# Altium footprint library PCB_DB_ADCS.PcbLib: 43 footprints (part 2 of 3)
Each footprint in its own frame and in the unit in brackets; x right, y up, seen from the top. Pads: shape width x height; smd on the part's side, far side on the other; paste and mask are expansions set on the pad; w line width, h text height; cw(c..) or ccw(c..) is an arc to the next point about the centre after c.
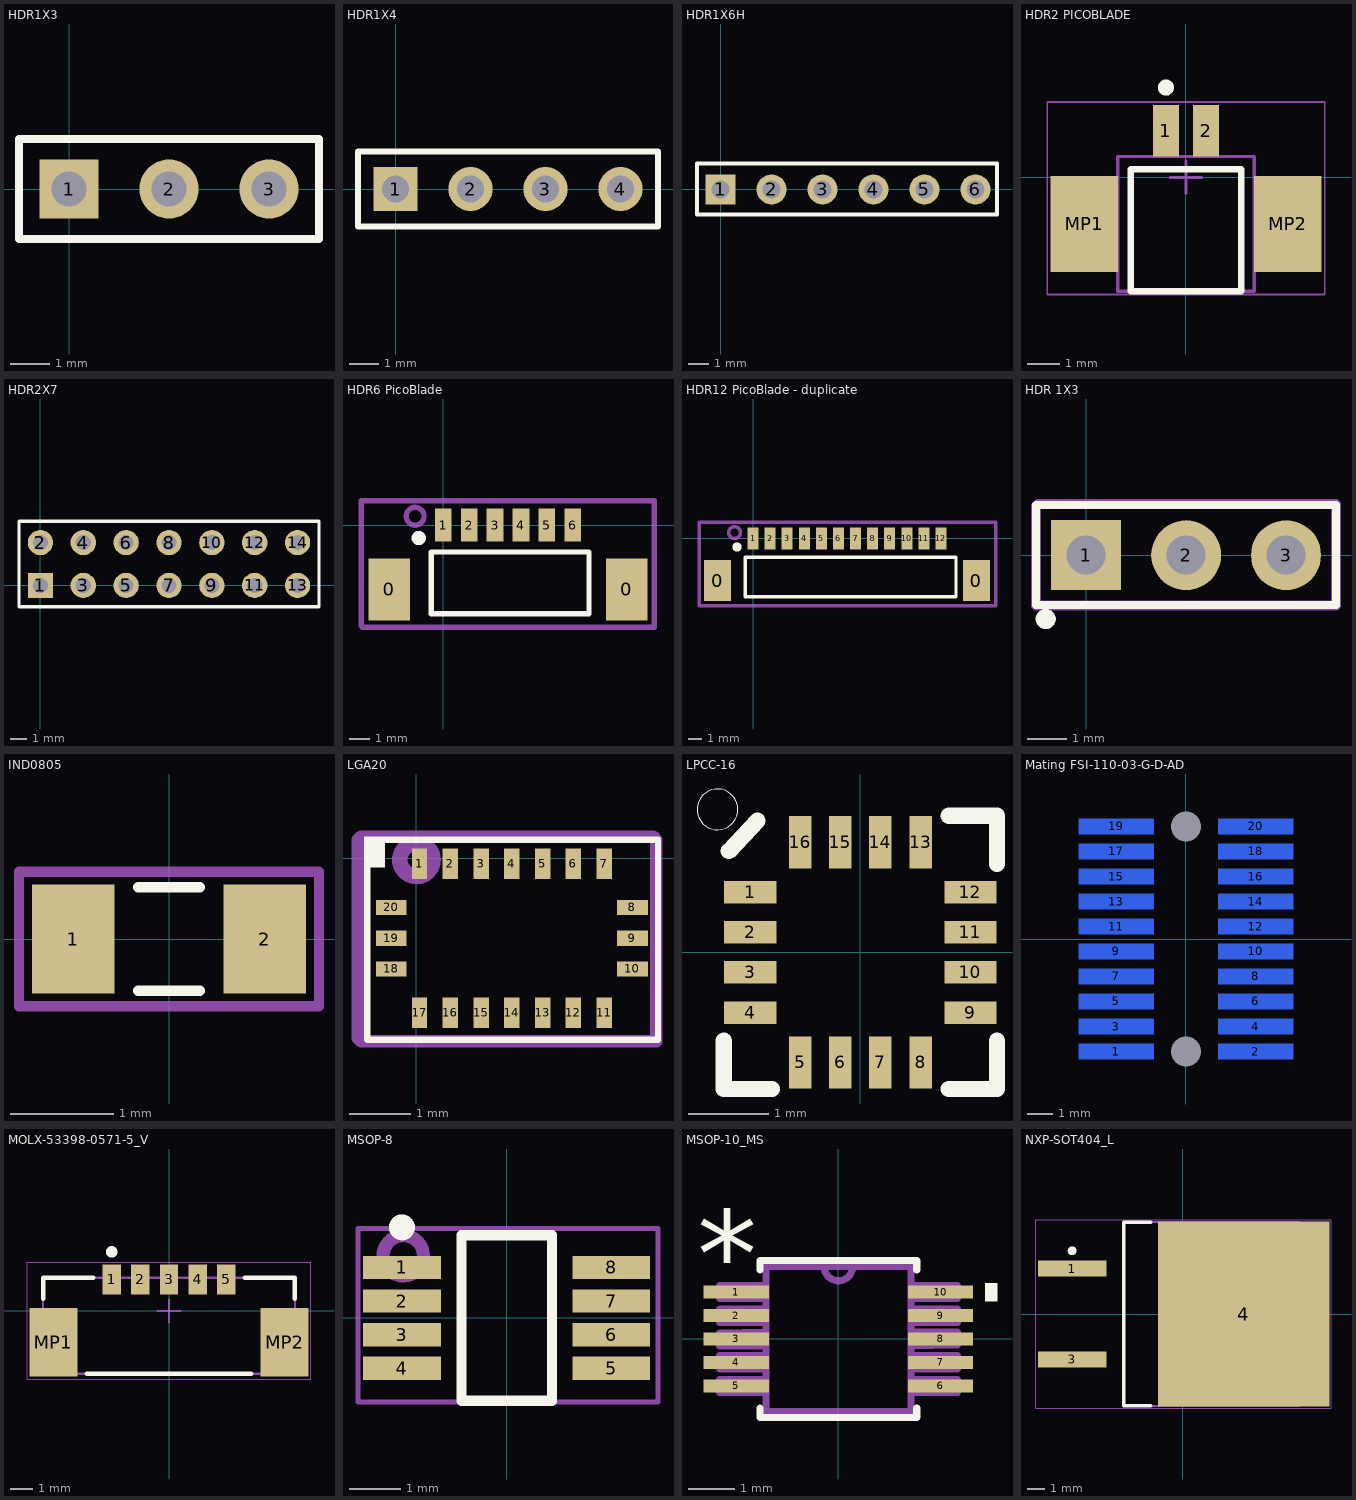
[diagram p1: the footprints below, top view; thin cyan lines are the x and y axes]

## HDR1X3 [mm]
pads (3):
  rect 1.5x1.5 hole 0.9: 1(0,0)
  round 1.5 hole 0.9: 2(2.54,0) 3(5.08,0)
Top Overlay:
  lines w0.2: -1.27,-1.27 6.35,-1.27 6.35,1.27 -1.27,1.27 -1.27,-1.27

## HDR1X4 [mm]
pads (4):
  rect 1.5x1.5 hole 0.9: 1(0,0)
  round 1.5 hole 0.9: 2(2.54,0) 3(5.08,0) 4(7.62,0)
Top Overlay:
  lines w0.2: -1.27,-1.27 8.89,-1.27 8.89,1.27 -1.27,1.27 -1.27,-1.27

## HDR1X6H [mm]
pads (6):
  rect 1.5x1.5 hole 0.9: 1(0,0)
  round 1.5 hole 0.9: 2(2.54,0) 3(5.08,0) 4(7.62,0) 5(10.16,0) 6(12.7,0)
Top Overlay:
  lines w0.2: -1.18,-1.24 13.78,-1.24 13.78,0.135 13.78,1.28 -1.18,1.28 -1.18,-1.24

## HDR2 PICOBLADE [mm] "Header, 2-Leads, Pitch 1.25mm"
height 3.4
pads (4):
  rect 0.8x1.6 smd: 1(-0.625,1.45) 2(0.625,1.45)
  rect 2.1x3 smd: MP1(-3.175,-1.45) MP2(3.175,-1.45)
Top Overlay:
  circle w0.25: c-0.625,2.8 r0.125
  lines w0.2: -1.725,-3.55 1.725,-3.55 1.725,0.25 -1.725,0.25 -1.725,-3.55
Mechanical 13:
  lines w0.1: -2.125,-3.55 2.125,-3.55 2.125,0.65 -2.125,0.65 -2.125,-3.55
Mechanical 15:
  lines w0.05: -4.325,-3.65 4.325,-3.65 4.325,2.35 -4.325,2.35 -4.325,-3.65
  lines w0.1: -0.5,0 0.5,0 ; 0,-0.5 0,0.5
3D body "532610271.stp": height 3.41, standoff 0.01, extent -3.825,-3.55 3.825,1.65

## HDR2X7 [mm]
pads (14):
  rect 1.5x1.5 hole 0.9: 1(0,0)
  round 1.5 hole 0.9: 2(0,2.54) 3(2.54,0) 4(2.54,2.54) 5(5.08,0) 6(5.08,2.54) 7(7.62,0) 8(7.62,2.54) 9(10.16,0) 10(10.16,2.54) 11(12.7,0) 12(12.7,2.54) 13(15.24,0) 14(15.24,2.54)
Top Overlay:
  lines w0.2: -1.27,-1.27 -1.27,3.81 16.51,3.81 16.51,-1.27 -1.27,-1.27

## HDR6 PicoBlade [mm]
pads (8):
  rect 2x3 smd: 0(-2.6,-3.1) 0(8.85,-3.1)
  rect 0.8x1.6 smd: 1(0,0) 2(1.25,0) 3(2.5,0) 4(3.75,0) 5(5,0) 6(6.25,0)
Top Overlay:
  circle w0.5: c-1.175,-0.625 r0.09
  lines w0.254: -0.574,-4.275 -0.574,-1.3 7.025,-1.3 7.025,-4.275 -0.574,-4.275
Mechanical 15:
  circle w0.254: c-1.35,0.425 r0.432
  lines w0.254: -3.95,-4.85 -3.875,-4.925 10.175,-4.925 10.175,1.175 -3.95,1.175 -3.95,-4.85
  text ".Designator" at 0.22,-0.39 h0.5
3D body "User Library-molex 5339853398-0671.STEP": height 4.7, standoff 0, extent -3.125,-4.325 9.525,-0.125

## HDR12 PicoBlade - duplicate [mm]
pads (14):
  rect 2x3 smd: 0(-2.6,-3.1) 0(16.35,-3.1)
  rect 0.8x1.6 smd: 1(0,0) 2(1.25,0) 3(2.5,0) 4(3.75,0) 5(5,0) 6(6.25,0) 7(7.5,0) 8(8.75,0) 9(10,0) 10(11.25,0) 11(12.5,0) 12(13.75,0)
Top Overlay:
  circle w0.5: c-1.175,-0.625 r0.09
  lines w0.254: -0.574,-4.275 14.85,-4.275 14.85,-1.372 -0.574,-1.372 -0.574,-4.275
Mechanical 15:
  circle w0.254: c-1.35,0.425 r0.432
  lines w0.254: 17.75,-4.925 -3.95,-4.925 -3.95,1.175 17.775,1.175 17.775,-4.85
  text ".Designator" at -2.57,-0.42 h0.5
3D body "User Library-molex 5339853398-1271.STEP": height 4.7, standoff 0, extent -3.2,-4.45 16.95,-0.25

## HDR 1X3 [mil]
pads (3):
  rect 70x70 hole 39: 1(0,0)
  round 70 hole 39: 2(100,0) 3(200,0)
Top Overlay:
  circle w10: c-40.45,-63.98 r5.02
  lines w8: -50,-50 -50,50 250,50 250,-50 -50,-50
Mechanical 15:
  lines w10: -50.2,-50.2 -50.2,49.21 -48.23,51.18 250,51.18 250,-50.2 -50.2,-50.2
  text ".Designator" at -29.13,-5.51 h19.68
3D body "Samtec-HTSW-103-07-G-S.STEP": height 330, standoff -100, extent -49.99,-49.99 250.01,50.01

## IND0805 [mm]
pads (2):
  rect 0.8x1.05 smd: 1(-0.925,0) 2(0.925,0)
Top Overlay:
  lines w0.1: -0.3,-0.5 0.3,-0.5 ; -0.3,0.5 0.3,0.5
Mechanical 15:
  lines w0.1: -1.45,-0.65 -1.45,0.65 1.45,0.65 1.45,-0.65 -1.45,-0.65
  text ".Designator" at -1.15,-0.1 h0.5
3D body "INDC0805(2012M).STEP": height 0.95, standoff 0, extent -1,-0.6 1,0.6

## LGA20 [mm]
pads (20):
  rect 0.25x0.5 smd: 1(0.05,-0.09) 2(0.55,-0.09) 3(1.05,-0.09) 4(1.55,-0.09) 5(2.05,-0.09) 6(2.55,-0.09) 7(3.05,-0.09) 11(3.05,-2.51) 12(2.55,-2.51) 13(2.05,-2.51) 14(1.55,-2.51) 15(1.05,-2.51) 16(0.55,-2.51) 17(0.05,-2.51)
  rect 0.5x0.25 smd: 8(3.51,-0.8) 9(3.51,-1.3) 10(3.51,-1.8) 18(-0.41,-1.8) 19(-0.41,-1.3) 20(-0.41,-0.8)
Top Overlay:
  rectangle: -0.85,-0.15 -0.51,0.35
  lines w0.1: -0.8,-2.95 -0.8,0.3 3.925,0.3 3.925,-2.95 -0.8,-2.95
Mechanical 15:
  circle w0.254: c0,-0.025 r0.27
  lines w0.203: -0.95,-2.925 -0.95,-2.119 -0.95,-0.506 -0.95,0.3 -0.9,0.35 3.85,0.35 3.9,0.3 3.9,-2.975 -0.9,-2.975 -0.95,-2.925
  text ".Designator" at 1.78,-1.82 h0.5
3D body: height 1, standoff 0.13, extent -0.7,-2.8 3.8,0.2

## LPCC-16 [mm]
pads (16):
  rect 0.65x0.28 smd: 1(-1.37,0.75) 2(-1.37,0.25) 3(-1.37,-0.25) 4(-1.37,-0.75) 9(1.37,-0.75) 10(1.37,-0.25) 11(1.37,0.25) 12(1.37,0.75)
  rect 0.28x0.65 smd: 5(-0.75,-1.37) 6(-0.25,-1.37) 7(0.25,-1.37) 8(0.75,-1.37) 13(0.75,1.37) 14(0.25,1.37) 15(-0.25,1.37) 16(-0.75,1.37)
Top Overlay:
  circle w0: c-1.778,1.778 r0.254
  lines w0.203: -1.7,-1.1 -1.7,-1.7 -1.1,-1.7 ; -1.635,1.26 -1.28,1.635 ; 1.1,-1.7 1.7,-1.7 1.7,-1.1 ; 1.1,1.7 1.7,1.7 1.7,1.1

## Mating FSI-110-03-G-D-AD [mm]
pads (22):
  rect 3x0.61 smd far side: 1(-2.8,-4.5) 2(2.8,-4.5) 3(-2.8,-3.5) 4(2.8,-3.5) 5(-2.8,-2.5) 6(2.8,-2.5) 7(-2.8,-1.5) 8(2.8,-1.5) 9(-2.8,-0.5) 10(2.8,-0.5) 11(-2.8,0.5) 12(2.8,0.5) 13(-2.8,1.5) 14(2.8,1.5) 15(-2.8,2.5) 16(2.8,2.5) 17(-2.8,3.5) 18(2.8,3.5) 19(-2.8,4.5) 20(2.8,4.5)
  round 0 hole 1.2: AT(0,-4.5) AT(0,4.5)
Bottom Overlay:
  lines w0.1: -4.625,-5.48 4.625,-5.48 4.625,5.6 -4.625,5.6 -4.625,-5.48
  text "DVCC" at -5.45,-4.775 h0.5
  text "ANT" at -5.7,-3.775 h0.5
  text "BAT" at -5.7,-2.75 h0.5
  text "CLK" at -5.7,0.2 h0.5
  text "MISO" at -5.492,1.25 h0.5
  text "MOSI" at -5.533,2.2 h0.5
  text "IC2C" at 7.2,3.625 h0.5
  text "ADC" at 6.992,1.167 h0.5
  text "GPIO" at 7.2,-1.292 h0.5
  text "GND" at 6.992,-3.75 h0.5
  text "CS" at -5.95,3.825 h0.5
  text "GPIO" at -5.492,-1.2 h0.5

## MOLX-53398-0571-5_V [mm] "CONN, 5-Leads, Body 11x4.2mm, Pitch 1.25mm"
height 4.7
pads (7):
  rect 0.8x1.3 smd: 1(-2.5,1.375) 2(-1.25,1.375) 3(0,1.375) 4(1.25,1.375) 5(2.5,1.375)
  rect 2.1x3 smd: MP1(-5.05,-1.375) MP2(5.05,-1.375)
Top Overlay:
  circle w0.25: c-2.5,2.577 r0.127
  lines w0.2: -5.5,0.525 -5.5,1.45 -3.3,1.45 ; -3.6,-2.75 3.6,-2.75 ; 3.3,1.45 5.5,1.45 5.5,0.525
Mechanical 13:
  lines w0.1: -5.5,-2.75 5.5,-2.75 5.5,1.45 -5.5,1.45 -5.5,-2.75
Mechanical 15:
  lines w0.05: -6.2,-2.975 6.2,-2.975 6.2,2.125 -6.2,2.125 -6.2,-2.975
  lines w0.1: -0.5,0 0.5,0 ; 0,-0.5 0,0.5
3D body "533980571.stp": height 4.7, standoff 0, extent -5.7,-2.75 5.7,1.45

## MSOP-8 [mm]
pads (8):
  rect 1.5x0.45 smd: 1(-2.025,0.975) 2(-2.025,0.325) 3(-2.025,-0.325) 4(-2.025,-0.975) 5(2.025,-0.975) 6(2.025,-0.325) 7(2.025,0.325) 8(2.025,0.975)
Top Overlay:
  circle w0.25: c-2.025,1.75 r0.125
  lines w0.2: -0.875,-1.6 -0.875,1.6 0.875,1.6 0.875,-1.6 -0.875,-1.6
Mechanical 15:
  circle w0.254: c-2,1.2 r0.391
  lines w0.1: -2.875,-1.625 -2.875,1.725 2.925,1.725 2.925,-1.625 -2.875,-1.625
  text ".Designator" at -1.754,-0.292 h0.5
3D body "MSOP-8 (MO-187-AA).STEP": height 1.1, standoff 0, extent -2.46,-1.5 2.459,1.5

## MSOP-10_MS [mil]
pads (10):
  rect 55x11 smd: 1(-86,39.4) 2(-86,19.7) 3(-86,0) 4(-86,-19.7) 5(-86,-39.4) 6(86,-39.4) 7(86,-19.7) 8(86,0) 9(86,19.7) 10(86,39.4)
Top Overlay:
  region: 133.5,46.9 133.5,31.9 123.5,31.9 123.5,46.9
  lines w6: -66,-58 -66,-66 66,-66 66,-58 ; -66,58 -66,66 66,66 66,58
  text "*" at -119,35.16 h73.82
Mechanical 4:
  lines w6: -100,-45 -100,-34 ; -100,-45 -61,-45 ; -100,-45 -100,-34 ; -100,-45 -61,-45 ; -100,-34 -61,-34 ; -100,-34 -61,-34 ; -100,-25 -100,-14 ; -100,-25 -61,-25 ; -100,-25 -100,-14 ; -100,-25 -61,-25 ; -100,-14 -61,-14 ; -100,-14 -61,-14 ; -100,-6 -100,5 ; -100,-6 -61,-6 ; -100,-6 -100,5 ; -100,-6 -61,-6 ; -100,5 -61,6 ; -100,5 -61,6 ; -100,14 -100,25 ; -100,14 -61,14 ; -100,14 -100,25 ; -100,14 -61,14 ; -100,25 -61,25 ; -100,25 -61,25 ; -100,34 -100,45 ; -100,34 -61,34 ; -100,34 -100,45 ; -100,34 -61,34 ; -100,45 -61,45 ; -100,45 -61,45 ; -61,-61 61,-61 ; -61,-61 -61,61 ; -61,-61 61,-61 ; -61,-61 -61,61 ; -61,-45 -61,-34 ; -61,-45 -61,-34 ; -61,-25 -61,-14 ; -61,-25 -61,-14 ; -61,-6 -61,6 ; -61,-6 -61,6 ; -61,14 -61,25 ; -61,14 -61,25 ; -61,34 -61,45 ; -61,34 -61,45 ; -61,61 -12,61 ; -61,61 -12,61 ; -12,61 ccw(c0,61) 12,61 ; -12,61 ccw(c0,61) 12,61 ; -12,61 12,61 ; -12,61 12,61 ; 12,61 61,61 ; 12,61 61,61 ; 61,-61 61,61 ; 61,-61 61,61 ; 61,-45 61,-34 ; 61,-45 100,-45 ; 61,-45 61,-34 ; 61,-45 100,-45 ; 61,-34 100,-34 ; 61,-34 100,-34 ; 61,-25 61,-14 ; 61,-25 100,-25 ; 61,-25 61,-14 ; 61,-25 100,-25 ; 61,-14 100,-14 ; 61,-14 100,-14 ; 61,-6 61,6 ; 61,-6 100,-5 ; 61,-6 61,6 ; 61,-6 100,-5 ; 61,6 100,6 ; 61,6 100,6 ; 61,14 61,25 ; 61,14 100,14 ; 61,14 61,25 ; 61,14 100,14 ; 61,25 100,25 ; 61,25 100,25 ; 61,34 61,45 ; 61,34 100,34 ; 61,34 61,45 ; 61,34 100,34 ; 61,45 100,45 ; 61,45 100,45 ; 100,-45 100,-34 ; 100,-45 100,-34 ; 100,-25 100,-14 ; 100,-25 100,-14 ; 100,-5 100,6 ; 100,-5 100,6 ; 100,14 100,25 ; 100,14 100,25 ; 100,34 100,45 ; 100,34 100,45
  text "*" at -69,-1.84 h73.82
  text "*" at -69,-1.84 h73.82
Mechanical 15:
  text ".Designator" at -6.34,3.03 h19.68

## NXP-SOT404_L [mm] "DPAK, 3-Leads, Body 10.3x9.8mm, Pitch 2.54mm, IPC High Density"
height 4.5
pads (3):
  rect 3.85x0.9 smd: 1(-6.2,2.54) 3(-6.2,-2.54)
  rect 9.6x10.35 smd: 4(3.4,0)
Top Overlay:
  circle w0.25: c-6.2,3.54 r0.125
  lines w0.2: -1.8,-5.15 -3.3,-5.15 -3.3,5.15 -1.8,5.15
Mechanical 13:
  lines w0.1: -3.3,-5.15 6.5,-5.15 6.5,5.15 -3.3,5.15 -3.3,-5.15
Mechanical 15:
  lines w0.05: -8.225,-5.275 8.3,-5.275 8.3,5.275 -8.225,5.275 -8.225,-5.275
  lines w0.1: -0.5,0 0.5,0 ; 0,-0.5 0,0.5
3D body: height 4.5, standoff 0, extent -3.3,-5.15 6.5,5.15